# Altium footprint library HARTING THD.PcbLib: 113 footprints (part 4 of 11) (continued)
## HARTING_09 06 131 6924 [mm] "DIN 41612, Type MH, 24+ 7 Contacts, Rows z+b+d, Performance level 2, Right Angled Male Connector" (continued)
  text "PCB Edge" at 9.525,-38.735 h1.2
Mechanical 14:
  circle w0.1: c7.62,7.62 r1.29
  circle w0.1: c7.62,-81.28 r1.29
  lines w0.1: -3.43,-76.63 10.77,-76.63 ; -0.68,3.62 10.77,3.62 10.77,6.87 21.32,6.87 21.32,3.97 19.82,3.97 19.82,-77.63 21.32,-77.63 21.32,-80.53 10.77,-80.53 ; 4.67,4.79 4.67,10.145 12.77,10.145 12.77,6.87 ; 10.77,4.79 -0.68,4.79 -0.68,-38.1 -0.83,-38.1 -0.83,-41.345 -2.63,-41.345 -2.63,-75.83 -3.43,-75.83 -3.43,-79.36 4.67,-79.36 4.67,-83.805 12.77,-83.805 12.77,-80.53 ; 10.77,-80.53 10.77,-76.63 ; 10.77,-80.53 10.77,-76.63
  text "d22" at -7.53,-51.55 h1.2
  text "z20" at -7.53,-46.47 h1.2
  text "d26" at -7.53,-61.71 h1.2
  text "z24" at -7.53,-56.63 h1.2
  text "d30" at -7.53,-71.87 h1.2
  text "z28" at -7.53,-66.79 h1.2
  text "z32" at -7.53,-76.95 h1.2
  text "b" at 2.223,1.905 h1.2
  text "2" at -2.765,-0.543 h1.2
  text "4" at -2.79,-5.685 h1.2
  text "z" at 4.608,1.905 h1.2
  text "d" at -0.318,1.905 h1.2
  text "6" at -2.79,-10.765 h1.2
  text "8" at -2.79,-15.845 h1.2
  text "10" at -3.74,-20.925 h1.2
  text "12" at -3.74,-26.005 h1.2
  text "14" at -3.74,-31.085 h1.2
  text "16" at -3.74,-36.165 h1.2
3D body "HARTING_09 06 131 6924.stp": height 11.22, standoff -3.48, extent -3.43,-83.805 21.32,10.145

## HARTING_09 06 148 6901 [mm] "DIN 41612, Type F, 48 Contacts, Rows z+b+d, Performance level 2, Right Angle Male Connector"
height 10.1
pads (50):
  round 1.7 hole 1: b2(2.54,-2.54) b4(2.54,-7.62) b6(2.54,-12.7) b8(2.54,-17.78) b10(2.54,-22.86) b12(2.54,-27.94) b14(2.54,-33.02) b16(2.54,-38.1) b18(2.54,-43.18) b20(2.54,-48.26) b22(2.54,-53.34) b24(2.54,-58.42) b26(2.54,-63.5) b28(2.54,-68.58) b30(2.54,-73.66) b32(2.54,-78.74) d2(0,-2.54) d4(0,-7.62) d6(0,-12.7) d8(0,-17.78) d10(0,-22.86) d12(0,-27.94) d14(0,-33.02) d16(0,-38.1) d18(0,-43.18) d20(0,-48.26) d22(0,-53.34) d24(0,-58.42) d26(0,-63.5) d28(0,-68.58) d30(0,-73.66) d32(0,-78.74) z2(5.08,-2.54) z4(5.08,-7.62) z6(5.08,-12.7) z8(5.08,-17.78) z10(5.08,-22.86) z12(5.08,-27.94) z14(5.08,-33.02) z16(5.08,-38.1) z18(5.08,-43.18) z20(5.08,-48.26) z22(5.08,-53.34) z24(5.08,-58.42) z26(5.08,-63.5) z28(5.08,-68.58) z30(5.08,-73.66) z32(5.08,-78.74)
  round 3.5 / inner round 3.5 / far side round 5.1 hole 2.8: MTG1(7.62,5.08) MTG2(7.62,-83.82)
Top Overlay:
  lines w0.2: -0.78,-80.29 10.8,-80.29 ; -0.78,-79.742 -0.78,-80.97 4.67,-80.97 4.67,-86.37 6.63,-86.37 ; -0.78,-1.538 -0.78,2.95 6,2.95 ; -0.78,1.83 10.8,1.83 10.8,4.38 21.32,4.38 21.32,1.48 19.82,1.48 19.82,-80.22 21.32,-80.22 21.32,-83.12 10.8,-83.12 10.8,-79.17 6.275,-79.17 ; 4.67,2.95 4.67,7.63 6.63,7.63 ; 8.255,-86.37 12.72,-86.37 ; 8.255,7.63 12.72,7.63 ; 9.2,2.95 10.8,2.95 ; 12.77,-86.37 12.77,-83.12 ; 12.77,4.38 12.77,7.63
  text "5" at -2.207,-10.795 h1.2
  text "30" at -3.477,-74.295 h1.2
  text "25" at -3.477,-61.595 h1.2
  text "20" at -3.477,-48.895 h1.2
  text "15" at -3.16,-36.195 h1.2
  text "10" at -3.16,-23.495 h1.2
  text "32" at -3.477,-79.375 h1.2
  text "b" at 2.222,-0.635 h1.2
  text "z" at 4.763,-0.635 h1.2
  text "1" at -1.89,-0.635 h1.2
  text "d" at -0.318,-0.635 h1.2
Mechanical 8:
  lines w0.1: -2,0 0,0 0,-2 ; -0.78,-77.738 -0.78,-74.662 ; -0.78,-72.658 -0.78,-69.582 ; -0.78,-67.578 -0.78,-64.502 ; -0.78,-62.498 -0.78,-59.422 ; -0.78,-57.418 -0.78,-54.355 ; -0.78,-52.326 -0.78,-49.262 ; -0.78,-47.258 -0.78,-44.182 ; -0.78,-42.178 -0.78,-39.102 ; -0.78,-37.098 -0.78,-34.022 ; -0.78,-32.018 -0.78,-28.942 ; -0.78,-26.938 -0.78,-23.862 ; -0.78,-21.858 -0.78,-18.782 ; -0.78,-16.778 -0.78,-13.702 ; -0.78,-11.698 -0.78,-8.622 ; -0.78,-6.618 -0.78,-3.542 ; 0.54,-39.37 2.54,-39.37 2.54,-41.37 ; 10.38,-78.74 10.38,0
Mechanical 14:
  lines w0.1: -0.78,-80.29 10.8,-80.29 ; -0.78,-79.17 10.8,-79.17 10.8,-83.12 21.32,-83.12 21.32,-80.22 19.82,-80.22 19.82,1.48 21.32,1.48 21.32,4.38 10.8,4.38 10.8,1.83 -0.78,1.83 ; 4.67,2.95 4.67,7.63 12.77,7.63 12.77,4.38 ; 10.8,2.95 -0.78,2.95 -0.78,-80.97 4.67,-80.97 4.67,-86.37 12.77,-86.37 12.77,-83.12
  text "1" at -1.89,-0.635 h1.2
  text "32" at -3.477,-79.375 h1.2
  text "10" at -3.16,-23.495 h1.2
  text "15" at -3.16,-36.195 h1.2
  text "20" at -3.477,-48.895 h1.2
  text "25" at -3.477,-61.595 h1.2
  text "30" at -3.477,-74.295 h1.2
  text "5" at -2.207,-10.795 h1.2
3D body "HARTING_09 06 148 6901.stp": height 11.25, standoff -3.55, extent -0.78,-86.37 21.32,7.63

## HARTING_09 06 203 2811 [mm] "DIN 41612, Type H, 3 Poles, Single Row, Straight Female Connector, Lead 4 mm, Pitch 5.08mm"
height 11.6
pads (5):
  round 2.3 hole 1.6: 1(-2.54,5.08) 2(2.54,0) 3(-2.54,-5.08)
  round 3.5 / inner round 3.5 / far side round 5.1 hole 2.8: MTG1(-0.3,13.25) MTG2(-0.3,-13.25)
Top Overlay:
  lines w0.2: -3.675,-6.136 -3.675,-10.175 ; -3.675,-4.024 -3.675,4.024 ; -3.675,6.136 -3.675,10.175 ; -3.475,-6.316 -3.475,-6.855 ; -3.475,-3.844 -3.475,-3.305 ; -3.475,3.844 -3.475,3.305 ; -3.475,6.316 -3.475,6.855 ; -3.275,-15.7 -3.275,-13.25 -2.034,-10.725 ; -3.275,15.7 -3.275,13.25 -2.034,10.725 ; -3.196,-6.484 -3.475,-6.855 ; -3.196,-3.676 -3.475,-3.305 ; -3.196,3.676 -3.475,3.305 ; -3.196,6.484 -3.475,6.855 ; -1.097,-5.645 2.565,-5.645 ; -1.097,-4.515 2.565,-4.515 ; -1.097,4.515 2.565,4.515 ; -1.097,5.645 2.565,5.645 ; 1.097,-0.565 -2.565,-0.565 ; 1.097,0.565 -2.565,0.565 ; 1.434,-10.725 2.675,-13.25 2.675,-15.7 ; 1.434,10.725 2.675,13.25 2.675,15.7 ; 3.196,-1.404 3.475,-1.775 ; 3.196,1.404 3.475,1.775 ; 3.475,-1.236 3.475,-1.775 ; 3.475,1.236 3.475,1.775 ; 3.675,-1.056 3.675,-9.125 ; 3.675,1.056 3.675,9.104 ; -4.225,-10.725 -4.225,10.725 ; -4.225,-10.725 1.675,-10.725 ; -4.225,-10.725 -3.675,-10.175 ; -4.225,10.725 1.675,10.725 ; -4.225,10.725 -3.675,10.175 ; -3.675,-10.175 1.125,-10.175 ; -3.675,10.175 1.125,10.175 ; -3.475,-6.855 3.475,-6.855 ; -3.475,-3.305 3.475,-3.305 ; -3.475,-1.775 3.475,-1.775 ; -3.475,-1.775 -3.475,1.775 ; -3.475,-1.775 -2.565,-0.565 ; -3.475,1.775 3.475,1.775 ; -3.475,1.775 -2.565,0.565 ; -3.475,3.305 3.475,3.305 ; -3.475,6.855 3.475,6.855 ; -2.565,-0.565 -2.565,0.565 ; 1.125,-10.175 1.675,-10.725 ; 1.125,-10.175 1.125,-9.125 ; 1.125,-9.125 1.675,-9.675 ; 1.125,-9.125 3.675,-9.125 ; 1.125,9.125 1.125,10.175 ; 1.125,9.125 1.675,9.675 ; 1.125,9.125 3.675,9.125 4.225,9.675 ; 1.125,10.175 1.675,10.725 ; 1.675,-10.725 1.675,-9.675 ; 1.675,-9.675 4.225,-9.675 ; 1.675,9.675 1.675,10.725 ; 1.675,9.675 4.225,9.675 ; 2.565,-5.645 3.475,-6.855 ; 2.565,-5.645 2.565,-4.515 ; 2.565,-4.515 3.475,-3.305 ; 2.565,4.515 3.475,3.305 ; 2.565,4.515 2.565,5.645 ; 2.565,5.645 3.475,6.855 ; 3.475,-6.855 3.475,-3.305 ; 3.475,3.305 3.475,6.855 ; 3.675,-9.125 4.225,-9.675 ; 4.225,-9.675 4.225,9.675 ; -5.25,-15.7 -5.25,15.7 5.25,15.7 5.25,-15.7 -5.25,-15.7
  text "1" at -6.44,4.555 h1.2
Mechanical 8:
  lines w0.1: -3.04,-5.08 -2.54,-5.08 ; -3.04,5.08 -2.54,5.08 ; -2.54,-5.58 -2.54,-5.08 ; -2.54,-4.58 -2.54,-5.08 ; -2.54,4.58 -2.54,5.08 ; -2.54,5.58 -2.54,5.08 ; -2.04,-5.08 -2.54,-5.08 ; -2.04,5.08 -2.54,5.08 ; -0.8,-13.25 -0.3,-13.25 ; -0.8,13.25 -0.3,13.25 ; -0.5,0 0,0 ; -0.3,-13.75 -0.3,-13.25 ; -0.3,-12.75 -0.3,-13.25 ; -0.3,12.75 -0.3,13.25 ; -0.3,13.75 -0.3,13.25 ; 0,-0.5 0,0 ; 0,0.5 0,0 ; 0.2,-13.25 -0.3,-13.25 ; 0.2,13.25 -0.3,13.25 ; 0.5,0 0,0
Mechanical 14:
  lines w0.1: -3.275,-15.7 -3.275,-13.25 -2.034,-10.725 ; -3.275,15.7 -3.275,13.25 -2.034,10.725 ; 1.434,-10.725 2.675,-13.25 2.675,-15.7 ; 1.434,10.725 2.675,13.25 2.675,15.7 ; -4.225,-10.725 -4.225,10.725 ; -4.225,-10.725 1.675,-10.725 ; -4.225,-10.725 -3.675,-10.175 ; -4.225,10.725 1.675,10.725 ; -4.225,10.725 -3.675,10.175 ; -3.675,-10.175 1.125,-10.175 ; -3.675,-10.175 -3.675,10.175 ; -3.675,10.175 1.125,10.175 ; -3.475,-6.855 3.475,-6.855 ; -3.475,-6.855 -3.475,-3.305 ; -3.475,-6.855 -2.565,-5.645 ; -3.475,-3.305 3.475,-3.305 ; -3.475,-3.305 -2.565,-4.515 ; -3.475,-1.775 3.475,-1.775 ; -3.475,-1.775 -3.475,1.775 ; -3.475,-1.775 -2.565,-0.565 ; -3.475,1.775 3.475,1.775 ; -3.475,1.775 -2.565,0.565 ; -3.475,3.305 3.475,3.305 ; -3.475,3.305 -3.475,6.855 ; -3.475,3.305 -2.565,4.515 ; -3.475,6.855 3.475,6.855 ; -3.475,6.855 -2.565,5.645 ; -2.565,-5.645 2.565,-5.645 ; -2.565,-5.645 -2.565,-4.515 ; -2.565,-4.515 2.565,-4.515 ; -2.565,-0.565 2.565,-0.565 ; -2.565,-0.565 -2.565,0.565 ; -2.565,0.565 2.565,0.565 ; -2.565,4.515 2.565,4.515 ; -2.565,4.515 -2.565,5.645 ; -2.565,5.645 2.565,5.645 ; 1.125,-10.175 1.675,-10.725 ; 1.125,-10.175 1.125,-9.125 ; 1.125,-9.125 1.675,-9.675 ; 1.125,-9.125 3.675,-9.125 ; 1.125,9.125 1.125,10.175 ; 1.125,9.125 1.675,9.675 ; 1.125,9.125 3.675,9.125 ; 1.125,10.175 1.675,10.725 ; 1.675,-10.725 1.675,-9.675 ; 1.675,-9.675 4.225,-9.675 ; 1.675,9.675 1.675,10.725 ; 1.675,9.675 4.225,9.675 ; 2.565,-5.645 3.475,-6.855 ; 2.565,-5.645 2.565,-4.515 ; 2.565,-4.515 3.475,-3.305 ; 2.565,-0.565 3.475,-1.775 ; 2.565,-0.565 2.565,0.565 ; 2.565,0.565 3.475,1.775 ; 2.565,4.515 3.475,3.305 ; 2.565,4.515 2.565,5.645 ; 2.565,5.645 3.475,6.855 ; 3.475,-6.855 3.475,-3.305 ; 3.475,-1.775 3.475,1.775 ; 3.475,3.305 3.475,6.855 ; 3.675,-9.125 3.675,9.125 ; 3.675,-9.125 4.225,-9.675 ; 3.675,9.125 4.225,9.675 ; 4.225,-9.675 4.225,9.675 ; -5.25,-15.7 -5.25,15.7 5.25,15.7 5.25,-15.7 -5.25,-15.7
  text "1" at -6.44,4.555 h1.2
  text "1" at -6.44,4.555 h1.2
  text "1" at -6.44,4.555 h1.2
3D body "HARTING_09 06 203 2811.stp": height 11.6, standoff -4, extent -5.25,-15.7 5.25,15.7

## HARTING_09 06 215 2811 [mm] "DIN 41612, Type H, 15 Poles, Rows z+d, Performance level 1, Low Profile Straight Female Connector, Lead 4.0 mm, Pitch 5.08mm"
height 10.1
pads (2):
  round 3.5 / inner round 3.5 / far side round 5.1 hole 2.8: MTG1(4.78,10.71) MTG2(4.78,-79.29)
Top Overlay:
  lines w0.2: -2.27,-77.358 -2.27,-80.04 ; -2.27,8.778 -2.27,11.46 ; 0.705,-77.358 0.705,-80.04 -2.27,-80.04 ; 0.705,8.778 0.705,11.46 -2.27,11.46 ; 1.869,-79.18 1.805,-79.29 1.805,-81.665 ; 1.869,10.6 1.805,10.71 1.805,13.085 ; 3.175,-81.665 1.805,-81.665 ; 3.175,13.085 1.805,13.085 ; 6.385,-81.665 7.755,-81.665 ; 6.385,13.085 7.755,13.085 ; 7.691,-79.18 7.755,-79.29 7.755,-81.665 ; 7.691,10.6 7.755,10.71 7.755,13.085 ; 9.455,-77.358 9.455,-80.04 12.43,-80.04 ; 9.455,8.778 9.455,11.46 12.43,11.46 ; 12.43,-77.358 12.43,-80.04 ; 12.43,8.778 12.43,11.46 ; -2.27,-80.04 -2.27,-80.665 ccw(c-1.27,-80.665) -1.27,-81.665 1.805,-81.665 ; -2.27,11.46 -2.27,12.085 cw(c-1.27,12.085) -1.27,13.085 1.805,13.085 ; 7.755,-81.665 11.43,-81.665 ccw(c11.43,-80.665) 12.43,-80.665 12.43,-80.04 ; 7.755,13.085 11.43,13.085 cw(c11.43,12.085) 12.43,12.085 12.43,11.46
  text "z4" at -5.5,-0.6 h1.2
  text "d6" at -5.5,-5.68 h1.2
  text "d10" at -6.395,-15.89 h1.2
  text "z8" at -5.5,-10.76 h1.2
  text "d14" at -6.395,-26.05 h1.2
  text "z12" at -6.395,-20.97 h1.2
  text "d18" at -6.395,-36.21 h1.2
  text "z16" at -6.395,-31.13 h1.2
  text "d22" at -6.395,-46.37 h1.2
  text "z20" at -6.395,-41.29 h1.2
  text "d26" at -6.52,-56.53 h1.2
  text "z24" at -6.395,-51.45 h1.2
  text "d30" at -6.395,-66.69 h1.2
  text "z28" at -6.395,-61.61 h1.2
  text "z32" at -6.395,-71.77 h1.2
Keep-Out Layer:
  board cut-out: -2.1,-76.7 -2.219,-76.7 -2.44,-76.609 -2.609,-76.44 -2.7,-76.219 -2.7,-76.1 -2.7,7.5 -2.7,7.619 -2.609,7.84 -2.44,8.009 -2.219,8.1 -2.1,8.1 12.3,8.1 12.419,8.1 12.64,8.008 12.808,7.84 12.9,7.619 12.9,7.5 12.9,-76.1 12.9,-76.219 12.809,-76.44 12.64,-76.609 12.419,-76.7 12.3,-76.7
Mechanical 1:
  lines w0.635: -2.7,-76.1 ccw(c-2.1,-76.1) -2.1,-76.7 12.3,-76.7 ccw(c12.3,-76.1) 12.9,-76.1 12.9,7.5 ccw(c12.3,7.5) 12.3,8.1 -2.1,8.1 ccw(c-2.1,7.5) -2.7,7.5 -2.7,-76.1
Mechanical 8:
  lines w0.05: -0.5,-71.12 0,-71.12 ; -0.5,-60.96 0,-60.96 ; -0.5,-50.8 0,-50.8 ; -0.5,-40.64 0,-40.64 ; -0.5,-30.48 0,-30.48 ; -0.5,-20.32 0,-20.32 ; -0.5,-10.16 0,-10.16 ; -0.5,0 0,0 ; 0,-71.62 0,-71.12 ; 0,-70.62 0,-71.12 ; 0,-61.46 0,-60.96 ; 0,-60.46 0,-60.96 ; 0,-51.3 0,-50.8 ; 0,-50.3 0,-50.8 ; 0,-41.14 0,-40.64 ; 0,-40.14 0,-40.64 ; 0,-30.98 0,-30.48 ; 0,-29.98 0,-30.48 ; 0,-20.82 0,-20.32 ; 0,-19.82 0,-20.32 ; 0,-10.66 0,-10.16 ; 0,-9.66 0,-10.16 ; 0,-0.5 0,0 ; 0,0.5 0,0 ; 0.5,-71.12 0,-71.12 ; 0.5,-60.96 0,-60.96 ; 0.5,-50.8 0,-50.8 ; 0.5,-40.64 0,-40.64 ; 0.5,-30.48 0,-30.48 ; 0.5,-20.32 0,-20.32 ; 0.5,-10.16 0,-10.16 ; 0.5,0 0,0 ; 4.28,-79.29 4.78,-79.29 ; 4.28,10.71 4.78,10.71 ; 4.78,-79.79 4.78,-79.29 ; 4.78,-78.79 4.78,-79.29 ; 4.78,10.21 4.78,10.71 ; 4.78,11.21 4.78,10.71 ; 5.28,-79.29 4.78,-79.29 ; 5.28,10.71 4.78,10.71 ; 9.66,-66.04 10.16,-66.04 ; 9.66,-55.88 10.16,-55.88 ; 9.66,-45.72 10.16,-45.72 ; 9.66,-35.56 10.16,-35.56 ; 9.66,-25.4 10.16,-25.4 ; 9.66,-15.24 10.16,-15.24 ; 9.66,-5.08 10.16,-5.08 ; 10.16,-66.54 10.16,-66.04 ; 10.16,-65.54 10.16,-66.04 ; 10.16,-56.38 10.16,-55.88 ; 10.16,-55.38 10.16,-55.88 ; 10.16,-46.22 10.16,-45.72 ; 10.16,-45.22 10.16,-45.72 ; 10.16,-36.06 10.16,-35.56 ; 10.16,-35.06 10.16,-35.56 ; 10.16,-25.9 10.16,-25.4 ; 10.16,-24.9 10.16,-25.4 ; 10.16,-15.74 10.16,-15.24 ; 10.16,-14.74 10.16,-15.24 ; 10.16,-5.58 10.16,-5.08 ; 10.16,-4.58 10.16,-5.08 ; 10.66,-66.04 10.16,-66.04 ; 10.66,-55.88 10.16,-55.88 ; 10.66,-45.72 10.16,-45.72 ; 10.66,-35.56 10.16,-35.56 ; 10.66,-25.4 10.16,-25.4 ; 10.66,-15.24 10.16,-15.24 ; 10.66,-5.08 10.16,-5.08 ; 5.08,-34.29 5.08,-33.79 5.08,-34.29 ; 5.08,-34.29 5.58,-34.29 5.08,-34.29 ; 5.08,-34.29 5.08,-34.79 5.08,-34.29 ; 5.08,-34.29 4.58,-34.29 5.08,-34.29
Mechanical 14:
  drawing of 585 lines, arcs and shapes, not listed
  text "z4" at -5.5,-0.6 h1.2
  text "d6" at -5.5,-5.68 h1.2
  text "d10" at -6.395,-15.89 h1.2
  text "z8" at -5.5,-10.76 h1.2
  text "d14" at -6.395,-26.05 h1.2
  text "z12" at -6.395,-20.97 h1.2
  text "d18" at -6.395,-36.21 h1.2
  text "z16" at -6.395,-31.13 h1.2
  text "d22" at -6.395,-46.37 h1.2
  text "z20" at -6.395,-41.29 h1.2
  text "d26" at -6.52,-56.53 h1.2
  text "z24" at -6.395,-51.45 h1.2
  text "d30" at -6.395,-66.69 h1.2
  text "z28" at -6.395,-61.61 h1.2
  text "z32" at -6.395,-71.77 h1.2
  text "z32" at -6.395,-71.77 h1.2
  text "z28" at -6.395,-61.61 h1.2
  text "d30" at -6.395,-66.69 h1.2
  text "z24" at -6.395,-51.45 h1.2
  text "d26" at -6.52,-56.53 h1.2
  text "z20" at -6.395,-41.29 h1.2
  text "d22" at -6.395,-46.37 h1.2
  text "z16" at -6.395,-31.13 h1.2
  text "d18" at -6.395,-36.21 h1.2
  text "z12" at -6.395,-20.97 h1.2
  text "d14" at -6.395,-26.05 h1.2
  text "z8" at -5.5,-10.76 h1.2
  text "d10" at -6.395,-15.89 h1.2
  text "d6" at -5.5,-5.68 h1.2
  text "z4" at -5.5,-0.6 h1.2
  text "z32" at -6.395,-71.77 h1.2
  text "z28" at -6.395,-61.61 h1.2
  text "d30" at -6.395,-66.69 h1.2
  text "z24" at -6.395,-51.45 h1.2
  text "d26" at -6.52,-56.53 h1.2
  text "z20" at -6.395,-41.29 h1.2
  text "d22" at -6.395,-46.37 h1.2
  text "z16" at -6.395,-31.13 h1.2
  text "d18" at -6.395,-36.21 h1.2
  text "z12" at -6.395,-20.97 h1.2
  text "d14" at -6.395,-26.05 h1.2
  text "z8" at -5.5,-10.76 h1.2
  text "d10" at -6.395,-15.89 h1.2
  text "d6" at -5.5,-5.68 h1.2
  text "z4" at -5.5,-0.6 h1.2
Drill Drawing:
  lines w0.1: -1.76,2.858 -2.7,3.2 ; -1.76,3.542 -2.7,3.2 ; 2.058,-75.76 2.4,-76.7 ; 2.058,7.16 2.4,8.1 ; 2.742,-75.76 2.4,-76.7 ; 2.742,7.16 2.4,8.1 ; 8.515,-75.049 11.249,-75.049 12.7,-76.5 ; 11.794,-76.077 12.7,-76.5 ; 11.96,2.858 12.9,3.2 ; 11.96,3.542 12.9,3.2 ; 12.277,-75.594 12.7,-76.5 ; -2.7,3.2 12.9,3.2 ; 2.4,-76.7 2.4,8.1
  text "84.8mm" at 3.9,-21.6 h1
  text "15.6mm" at 5,3.5 h1
  text "r0.6" at 8.759,-74.839 h1
3D body "HARTING_09 06 215 2811.stp": height 9.99, standoff -20.93, extent -2.27,-81.665 12.43,13.085

## HARTING_09 06 215 2821 [mm] "DIN 41612, Type H, 15 Poles, Rows z+d, Performance level 1, Low Profile Straight Female Connector, Lead 4.0 mm, Pitch 5.08mm"
height 10.1
pads (17):
  round 2.3 hole 1.6: d6(10.16,-5.08) d10(10.16,-15.24) d14(10.16,-25.4) d18(10.16,-35.56) d22(10.16,-45.72) d26(10.16,-55.88) d30(10.16,-66.04) z4(0,0) z8(0,-10.16) z12(0,-20.32) z16(0,-30.48) z20(0,-40.64) z24(0,-50.8) z28(0,-60.96) z32(0,-71.12)
  round 3.5 / inner round 3.5 / far side round 5.1 hole 2.8: MTG1(4.78,10.71) MTG2(4.78,-79.29)
Top Overlay:
  lines w0.2: -1.105,-74.24 -2.27,-74.24 ; -1.105,-72.277 -1.105,-76.7 0.855,-76.7 0.855,-76.15 0.855,-75.13 9.305,-75.13 9.305,-76.15 9.305,-76.7 11.265,-76.7 11.265,-67.197 ; -1.105,1.157 -1.105,8.12 11.265,8.12 11.265,-3.923 ; -1.105,5.66 -2.27,5.66 ; 0.705,-76.7 0.705,-80.04 -2.27,-80.04 ; 0.705,8.12 0.705,11.46 -2.27,11.46 ; 3.175,-81.665 1.805,-81.665 ; 3.175,13.085 1.805,13.085 ; 3.3,8.12 1.805,10.71 1.805,13.085 ; 6.26,8.12 7.755,10.71 7.755,13.085 ; 6.385,-81.665 7.755,-81.665 ; 6.385,13.085 7.755,13.085 ; 9.455,-76.7 9.455,-80.04 12.43,-80.04 ; 9.455,8.12 9.455,11.46 12.43,11.46 ; 11.265,-74.24 12.43,-74.24 ; 11.265,5.66 12.43,5.66 ; -2.27,-80.04 -2.27,-80.665 ccw(c-1.27,-80.665) -1.27,-81.665 1.805,-81.665 ; -2.27,-80.04 -2.27,-74.24 ; -2.27,-74.24 -2.27,5.66 ; -2.27,5.66 -2.27,11.46 ; -2.27,11.46 -2.27,12.085 cw(c-1.27,12.085) -1.27,13.085 1.805,13.085 ; 1.805,-81.665 1.805,-79.29 3.378,-76.565 6.182,-76.565 7.755,-79.29 7.755,-81.665 ; 7.755,-81.665 11.43,-81.665 ccw(c11.43,-80.665) 12.43,-80.665 12.43,-80.04 ; 7.755,13.085 11.43,13.085 cw(c11.43,12.085) 12.43,12.085 12.43,11.46 ; 12.43,-80.04 12.43,-74.24 ; 12.43,-74.24 12.43,5.66 ; 12.43,5.66 12.43,11.46
  text "z32" at -6.02,-71.695 h1.2
  text "z28" at -6.02,-61.535 h1.2
  text "d30" at -6.02,-66.615 h1.2
  text "z24" at -6.02,-51.375 h1.2
  text "d26" at -6.145,-56.455 h1.2
  text "z20" at -6.02,-41.215 h1.2
  text "d22" at -6.02,-46.295 h1.2
  text "z16" at -6.02,-31.055 h1.2
  text "d18" at -6.02,-36.135 h1.2
  text "z12" at -6.02,-20.895 h1.2
  text "d14" at -6.02,-25.975 h1.2
  text "z8" at -5.125,-10.685 h1.2
  text "d10" at -6.02,-15.815 h1.2
  text "d6" at -5.125,-5.605 h1.2
  text "z4" at -5.125,-0.525 h1.2
Mechanical 8:
  lines w0.1: -0.5,-71.12 0,-71.12 ; -0.5,-60.96 0,-60.96 ; -0.5,-50.8 0,-50.8 ; -0.5,-40.64 0,-40.64 ; -0.5,-30.48 0,-30.48 ; -0.5,-20.32 0,-20.32 ; -0.5,-10.16 0,-10.16 ; -0.5,0 0,0 ; 0,-71.62 0,-71.12 ; 0,-70.62 0,-71.12 ; 0,-61.46 0,-60.96 ; 0,-60.46 0,-60.96 ; 0,-51.3 0,-50.8 ; 0,-50.3 0,-50.8 ; 0,-41.14 0,-40.64 ; 0,-40.14 0,-40.64 ; 0,-30.98 0,-30.48 ; 0,-29.98 0,-30.48 ; 0,-20.82 0,-20.32 ; 0,-19.82 0,-20.32 ; 0,-10.66 0,-10.16 ; 0,-9.66 0,-10.16 ; 0,-0.5 0,0 ; 0,0.5 0,0 ; 0.5,-71.12 0,-71.12 ; 0.5,-60.96 0,-60.96 ; 0.5,-50.8 0,-50.8 ; 0.5,-40.64 0,-40.64 ; 0.5,-30.48 0,-30.48 ; 0.5,-20.32 0,-20.32 ; 0.5,-10.16 0,-10.16 ; 0.5,0 0,0 ; 4.28,-79.29 4.78,-79.29 ; 4.28,10.71 4.78,10.71 ; 4.78,-79.79 4.78,-79.29 ; 4.78,-78.79 4.78,-79.29 ; 4.78,10.21 4.78,10.71 ; 4.78,11.21 4.78,10.71 ; 5.28,-79.29 4.78,-79.29 ; 5.28,10.71 4.78,10.71 ; 9.66,-66.04 10.16,-66.04 ; 9.66,-55.88 10.16,-55.88 ; 9.66,-45.72 10.16,-45.72 ; 9.66,-35.56 10.16,-35.56 ; 9.66,-25.4 10.16,-25.4 ; 9.66,-15.24 10.16,-15.24 ; 9.66,-5.08 10.16,-5.08 ; 10.16,-66.54 10.16,-66.04 ; 10.16,-65.54 10.16,-66.04 ; 10.16,-56.38 10.16,-55.88 ; 10.16,-55.38 10.16,-55.88 ; 10.16,-46.22 10.16,-45.72 ; 10.16,-45.22 10.16,-45.72 ; 10.16,-36.06 10.16,-35.56 ; 10.16,-35.06 10.16,-35.56 ; 10.16,-25.9 10.16,-25.4 ; 10.16,-24.9 10.16,-25.4 ; 10.16,-15.74 10.16,-15.24 ; 10.16,-14.74 10.16,-15.24 ; 10.16,-5.58 10.16,-5.08 ; 10.16,-4.58 10.16,-5.08 ; 10.66,-66.04 10.16,-66.04 ; 10.66,-55.88 10.16,-55.88 ; 10.66,-45.72 10.16,-45.72 ; 10.66,-35.56 10.16,-35.56 ; 10.66,-25.4 10.16,-25.4 ; 10.66,-15.24 10.16,-15.24 ; 10.66,-5.08 10.16,-5.08 ; 5.08,-34.29 5.08,-33.79 5.08,-34.29 ; 5.08,-34.29 5.58,-34.29 5.08,-34.29 ; 5.08,-34.29 5.08,-34.79 5.08,-34.29 ; 5.08,-34.29 4.58,-34.29 5.08,-34.29
Mechanical 14:
  drawing of 585 lines, arcs and shapes, not listed
  text "z4" at -5.125,-0.525 h1.2
  text "d6" at -5.125,-5.605 h1.2
  text "d10" at -6.02,-15.815 h1.2
  text "z8" at -5.125,-10.685 h1.2
  text "d14" at -6.02,-25.975 h1.2
  text "z12" at -6.02,-20.895 h1.2
  text "d18" at -6.02,-36.135 h1.2
  text "z16" at -6.02,-31.055 h1.2
  text "d22" at -6.02,-46.295 h1.2
  text "z20" at -6.02,-41.215 h1.2
  text "d26" at -6.145,-56.455 h1.2
  text "z24" at -6.02,-51.375 h1.2
  text "d30" at -6.02,-66.615 h1.2
  text "z28" at -6.02,-61.535 h1.2
  text "z32" at -6.02,-71.695 h1.2
  text "z4" at -5.125,-0.525 h1.2
  text "d6" at -5.125,-5.605 h1.2
  text "d10" at -6.02,-15.815 h1.2
  text "z8" at -5.125,-10.685 h1.2
  text "d14" at -6.02,-25.975 h1.2
  text "z12" at -6.02,-20.895 h1.2
  text "d18" at -6.02,-36.135 h1.2
  text "z16" at -6.02,-31.055 h1.2
  text "d22" at -6.02,-46.295 h1.2
  text "z20" at -6.02,-41.215 h1.2
  text "d26" at -6.145,-56.455 h1.2
  text "z24" at -6.02,-51.375 h1.2
  text "d30" at -6.02,-66.615 h1.2
  text "z28" at -6.02,-61.535 h1.2
  text "z32" at -6.02,-71.695 h1.2
  text "z32" at -6.02,-71.695 h1.2
  text "z28" at -6.02,-61.535 h1.2
  text "d30" at -6.02,-66.615 h1.2
  text "z24" at -6.02,-51.375 h1.2
  text "d26" at -6.145,-56.455 h1.2
  text "z20" at -6.02,-41.215 h1.2
  text "d22" at -6.02,-46.295 h1.2
  text "z16" at -6.02,-31.055 h1.2
  text "d18" at -6.02,-36.135 h1.2
  text "z12" at -6.02,-20.895 h1.2
  text "d14" at -6.02,-25.975 h1.2
  text "z8" at -5.125,-10.685 h1.2
  text "d10" at -6.02,-15.815 h1.2
  text "d6" at -5.125,-5.605 h1.2
  text "z4" at -5.125,-0.525 h1.2
3D body "HARTING_09 06 215 2821.stp": height 10.1, standoff -4, extent -2.27,-81.665 12.43,13.085